# Altium footprint library 模块.PcbLib: 18 footprints (part 2 of 2)
Each footprint in its own frame and in the unit in brackets; x right, y up, seen from the top. Pads: shape width x height; smd on the part's side, far side on the other; paste and mask are expansions set on the pad; w line width, h text height; cw(c..) or ccw(c..) is an arc to the next point about the centre after c.
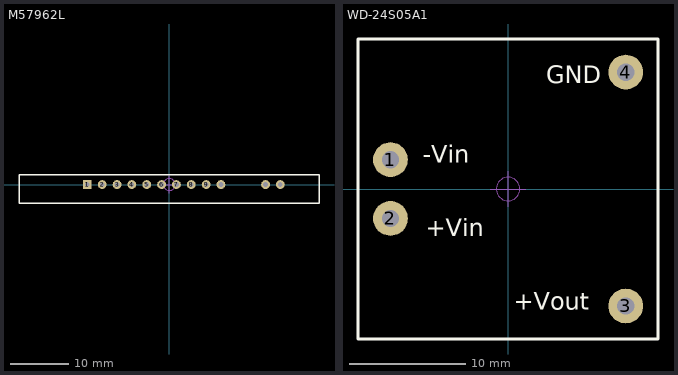
[diagram p1: the footprints below, top view; thin cyan lines are the x and y axes]

## M57962L [mm] "IGBT驱动模块"
pads (12):
  rect 1.5x1.5 hole 0.8: 1(-14.021,0)
  round 1.5 hole 0.8: 2(-11.481,0) 3(-8.941,0) 4(-6.401,0) 5(-3.861,0) 6(-1.321,0) 7(1.219,0) 8(3.759,0) 9(6.299,0) 10(8.839,0) 13(16.459,0) 14(18.999,0)
Top Overlay:
  lines w0.254: -25.705,-3.175 -25.705,1.651 24.079,1.651 25.603,1.651 25.603,-3.175 -25.705,-3.175
Mechanical 15:
  circle w0.1: c0,0 r1.016
  lines w0.1: -1.524,0 1.524,0 ; 0,-1.524 0,1.524
3D body "M57962L.STEP": height 25, standoff -4.64, extent -25.5,-3 25.5,1.5

## WD-24S05A1 [mm] "3W-24V转5V模块"
pads (4):
  round 3 hole 1.5: 1(-10.15,2.538) 2(-10.15,-2.542) 3(10.17,-10.102) 4(10.17,10.098)
Top Overlay:
  lines w0.254: -12.954,-12.954 -12.954,12.954 12.954,12.954 12.954,-12.954 -12.954,-12.954
  text "+Vin" at -7.112,-4.064 h1.52
  text "-Vin" at -7.366,2.286 h1.52
  text "GND" at 3.302,9.144 h1.52
  text "+Vout" at 0.508,-10.414 h1.52
Mechanical 15:
  circle w0.1: c0,0 r1.016
  lines w0.1: -1.524,0 1.524,0 ; 0,-1.524 0,1.524
3D body "WD3-24S05A1.STEP": height 8.6, standoff -3.1, extent -12.75,-12.75 12.75,12.75